# Altium footprint library myPcbLib.PcbLib: 987 footprints (part 43 of 62)
Each footprint in its own frame and in the unit in brackets; x right, y up, seen from the top. Pads: shape width x height; smd on the part's side, far side on the other; paste and mask are expansions set on the pad; w line width, h text height; cw(c..) or ccw(c..) is an arc to the next point about the centre after c.
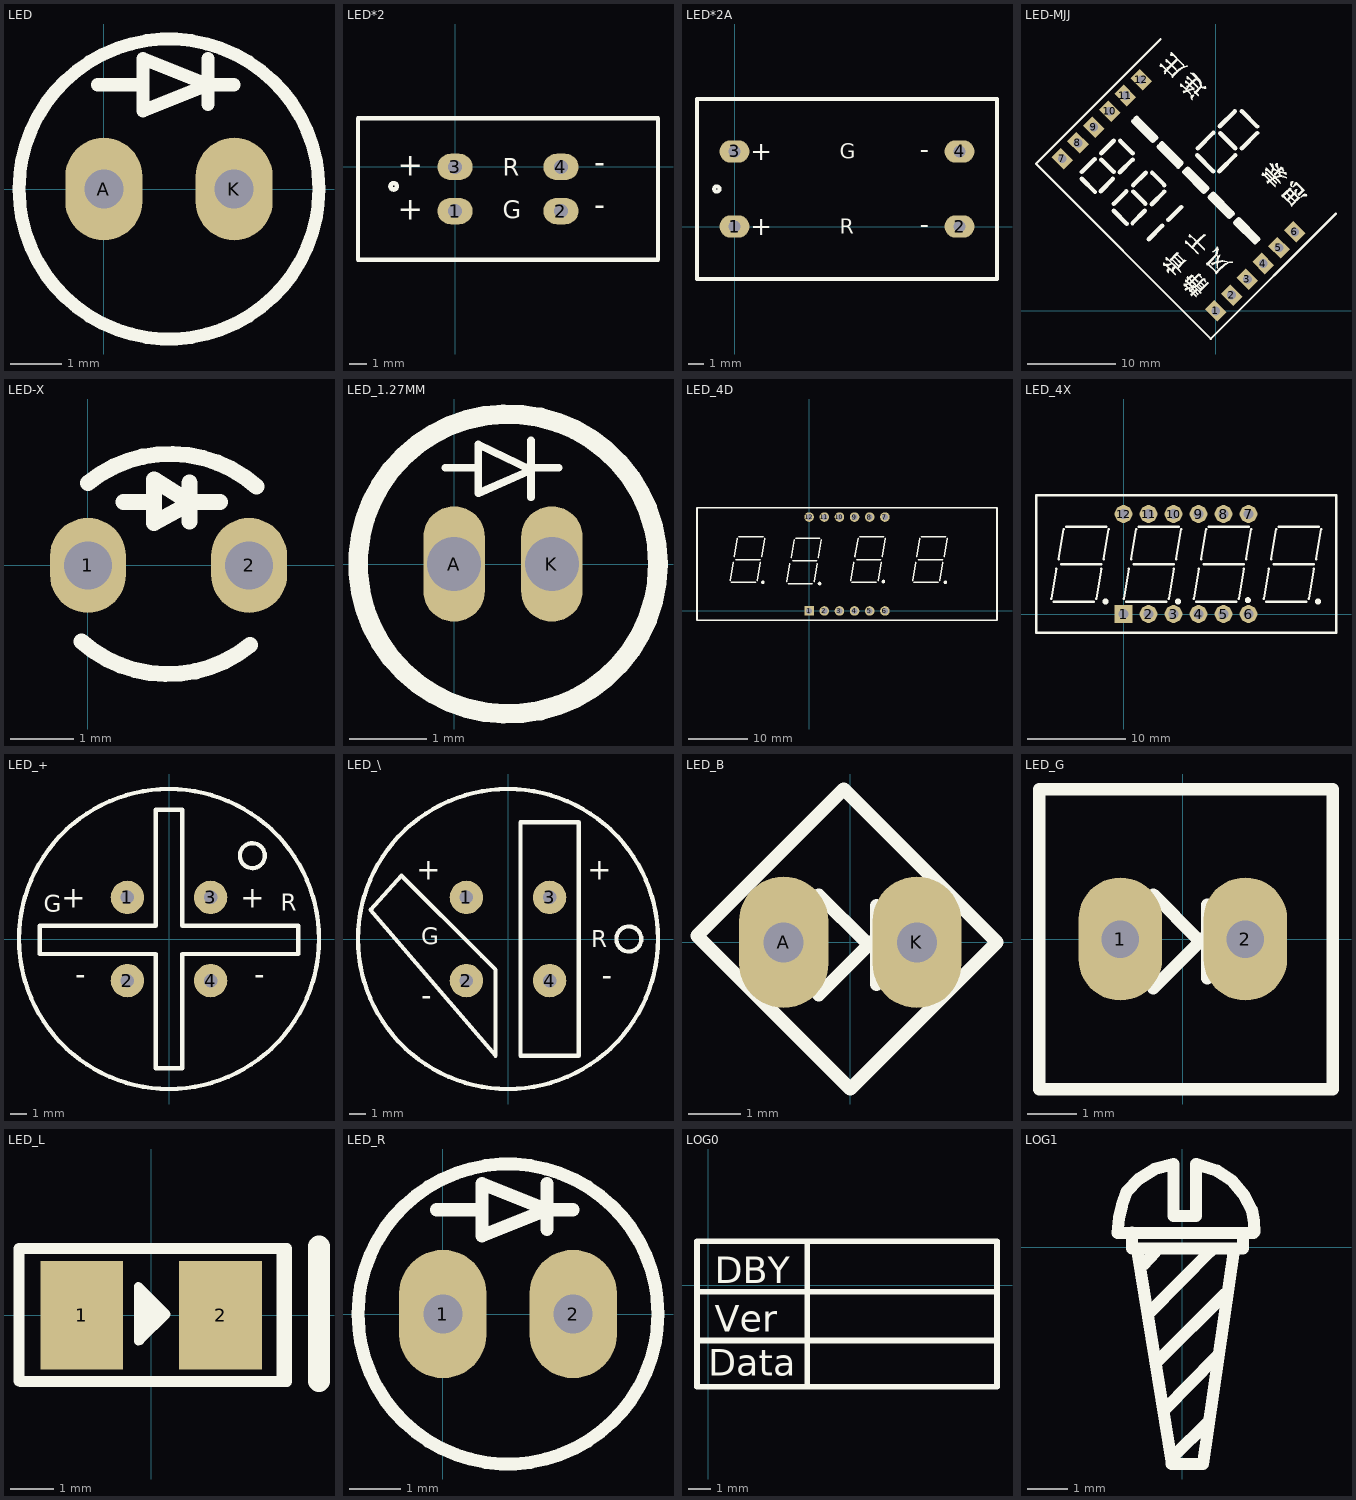
[diagram p42: the footprints below, top view; thin cyan lines are the x and y axes]

## LED [mm]
height 8
pads (2):
  oval 1.5x2 hole 0.762: A(0,0) K(2.54,0)
Top Overlay:
  circle w0.254: c1.27,0 r2.924
  lines w0.254: -0.127,2.032 0.762,2.032 ; 2.032,1.651 2.032,2.54 ; 2.54,2.032 2.032,2.032 ; 2.032,2.032 0.762,2.54 0.762,1.524 2.032,2.032

## LED*2 [mm]
pads (4):
  oval 2x1.5 hole 0.8: 1(0,-2.5) 2(6,-2.5) 3(0,0) 4(6,0)
Top Overlay:
  circle w0.254: c-3.48,-1.1 r0.18
  lines w0.254: -5.5,-5.25 11.5,-5.25 11.5,2.75 0,2.75 -5.5,2.75 -5.5,-5.25
  text "+" at -1.8,-1.9 h1.27
  text "-" at 8.5,-1.8 h1.27
  text "R" at 2.7,-0.5 h1
  text "G" at 2.7,-2.9 h1
  text "+" at -1.8,0.6 h1.27
  text "-" at 8.5,0.6 h1.27

## LED*2A [mm]
pads (4):
  oval 2x1.5 hole 0.8: 1(0,0) 2(15,0) 3(0,5) 4(15,5)
Top Overlay:
  circle w0.254: c-1.18,2.5 r0.18
  lines w0.254: -2.5,-3.5 17.5,-3.5 17.5,8.5 -2.5,8.5 -2.5,-3.5
  text "+" at 2.5,0.5 h1.27
  text "-" at 13,0.5 h1.27
  text "R" at 7,-0.5 h1
  text "G" at 7,4.5 h1
  text "+" at 2.5,5.5 h1.27
  text "-" at 13,5.5 h1.27

## LED-MJJ [mm]
pads (12):
  rect 1.5x2 hole 1 rot 45: 1(0,0) 2(1.796,1.796) 3(3.592,3.592) 4(5.388,5.388) 5(7.184,7.184) 6(8.98,8.98) 7(-17.452,17.293) 8(-15.656,19.089) 9(-13.86,20.885) 10(-12.064,22.681) 11(-10.268,24.477) 12(-8.472,26.273)
Top Overlay:
  drawing of 1385 lines, arcs and shapes, not listed

## LED-X [mm]
height 8
pads (2):
  oval 1.2x1.5 hole 0.762: 1(0,0) 2(2.54,0)
Top Overlay:
  lines w0.254: -0.1,-1.2 ccw(c1.259,0.337) 2.555,-1.253 ; 0,1.3 cw(c1.296,-0.291) 2.655,1.247 ; 0.559,1 1.016,1 ; 1.6,0.695 1.6,1.305 ; 1.6,1 1.041,1.356 1.041,0.67 1.651,1 ; 1.625,1 2.083,1

## LED_1.27MM [mm]
height 8
pads (2):
  oval 0.8x1.5 hole 0.7: A(0,0) K(1.27,0)
Top Overlay:
  circle w0.254: c0.7,0 r1.95
  lines w0.1: -0.118,1.25 0.314,1.25 ; 1,0.869 1,1.606 ; 1,1.25 1.356,1.25 ; 0.314,0.92 1,1.225 0.314,1.555 0.314,0.92

## LED_4D [mm]
pads (12):
  rect 1.6x1.6 hole 1: 1(0,0)
  round 1.6 hole 1: 2(2.54,0) 3(5.08,0) 4(7.62,0) 5(10.16,0) 6(12.7,0) 7(12.7,15.748) 8(10.16,15.748) 9(7.62,15.748) 10(5.08,15.748) 11(2.54,15.748) 12(0,15.748)
Top Overlay:
  circle w0.508: c-7.751,4.8 r0.051
  circle w0.508: c12.454,4.932 r0.051
  circle w0.508: c1.749,4.6 r0.051
  circle w0.508: c22.849,4.8 r0.051
  lines w0.254: -13.239,5.097 -12.731,8.145 ; -13.034,4.8 -8.97,4.8 ; -12.526,9.118 -12.018,12.166 ; -12.272,8.61 -8.208,8.61 ; -11.764,12.42 -7.7,12.42 ; -8.667,5.097 -8.159,8.145 ; -7.954,9.118 -7.446,12.166 ; -3.739,4.897 -3.231,7.945 ; -3.534,4.6 0.53,4.6 ; -3.026,8.918 -2.518,11.966 ; -2.772,8.41 1.292,8.41 ; -2.264,12.22 1.8,12.22 ; 0.833,4.897 1.341,7.945 ; 1.546,8.918 2.054,11.966 ; 6.978,5.1 7.486,8.148 ; 7.183,4.803 11.247,4.803 ; 7.691,9.121 8.199,12.169 ; 7.945,8.613 12.009,8.613 ; 8.453,12.423 12.517,12.423 ; 11.55,5.1 12.058,8.148 ; 12.263,9.121 12.771,12.169 ; 17.361,5.097 17.869,8.145 ; 17.566,4.8 21.63,4.8 ; 18.074,9.118 18.582,12.166 ; 18.328,8.61 22.392,8.61 ; 18.836,12.42 22.9,12.42 ; 21.933,5.097 22.441,8.145 ; 22.646,9.118 23.154,12.166 ; -18.796,-1.524 31.496,-1.524 31.496,17.272 -18.796,17.272 -18.796,-1.524

## LED_4X [mm]
pads (12):
  rect 1.8x1.8 hole 1: 1(0,0)
  round 1.8 hole 1: 2(2.54,0) 3(5.08,0) 4(7.62,0) 5(10.16,0) 6(12.7,0) 7(12.7,10.16) 8(10.16,10.16) 9(7.62,10.16) 10(5.08,10.16) 11(2.54,10.16) 12(0,10.16)
Top Overlay:
  circle w0.508: c19.761,1.27 r0.051
  circle w0.508: c5.537,1.27 r0.051
  circle w0.508: c12.637,1.399 r0.051
  circle w0.508: c-1.829,1.27 r0.051
  lines w0.254: -7.317,1.567 -6.809,4.615 ; -7.112,1.27 -3.048,1.27 ; -6.604,5.588 -6.096,8.636 ; -6.35,5.08 -2.286,5.08 ; -5.842,8.89 -1.778,8.89 ; -2.745,1.567 -2.237,4.615 ; -2.032,5.588 -1.524,8.636 ; 0.049,1.567 0.557,4.615 ; 0.254,1.27 4.318,1.27 ; 0.762,5.588 1.27,8.636 ; 1.016,5.08 5.08,5.08 ; 1.524,8.89 5.588,8.89 ; 4.621,1.567 5.129,4.615 ; 5.334,5.588 5.842,8.636 ; 7.161,1.567 7.669,4.615 ; 7.366,1.27 11.43,1.27 ; 7.874,5.588 8.382,8.636 ; 8.128,5.08 12.192,5.08 ; 8.636,8.89 12.7,8.89 ; 11.733,1.567 12.241,4.615 ; 12.446,5.588 12.954,8.636 ; 14.273,1.567 14.781,4.615 ; 14.478,1.27 18.542,1.27 ; 14.986,5.588 15.494,8.636 ; 15.24,5.08 19.304,5.08 ; 15.748,8.89 19.812,8.89 ; 18.845,1.567 19.353,4.615 ; 19.558,5.588 20.066,8.636 ; -8.89,-1.905 -8.89,12.065 21.59,12.065 21.59,-1.905 -8.89,-1.905

## LED_+ [mm]
pads (4):
  round 2 hole 0.8: 1(-2.5,2.5) 2(-2.5,-2.5) 3(2.5,2.5) 4(2.5,-2.5)
Top Overlay:
  circle w0.254: c5,5 r0.75
  circle w0.254: c0,0 r9
  lines w0.254: -7.75,-0.9 -0.8,-0.9 -0.8,-7.75 0.8,-7.75 0.8,-0.9 7.75,-0.9 7.75,0.8 0.8,0.8 0.8,7.75 -0.8,7.75 -0.8,0.8 -7.75,0.8 -7.75,-0.9
  text "-" at -5,-1.75 h1.27
  text "+" at -5,3 h1.27
  text "G" at -7.5,1.6 h1
  text "R" at 6.7,1.7 h1
  text "-" at 5.75,-1.75 h1.27
  text "+" at 5.75,3 h1.27

## LED_\ [mm]
pads (4):
  round 2 hole 0.8: 1(-2.5,2.5) 2(-2.5,-2.5) 3(2.5,2.5) 4(2.5,-2.5)
Top Overlay:
  circle w0.254: c7.25,0 r0.75
  circle w0.254: c0,0 r9
  lines w0.254: -8.25,1.75 -0.75,-7 -0.75,-1.841 -1.54,-1.051 -6.388,3.798 -8.25,1.75 ; 0.75,-7 0.75,7 4.25,7 4.25,-7 0.75,-7
  text "-" at -4.572,-3.023 h1.27
  text "+" at -4.039,4.674 h1.27
  text "G" at -5.207,-0.356 h1
  text "R" at 5,-0.5 h1
  text "-" at 6.248,-1.803 h1.27
  text "+" at 6.223,4.674 h1.27

## LED_B [mm]
height 8
pads (2):
  oval 1.7x2.5 hole 0.762: A(-1.27,0) K(1.27,0)
Top Overlay:
  lines w0.254: -1.6,0 -0.8,0 ; 0.4,0 -0.6,-1 -0.6,0.9 0.3,0 0.6,0 ; 0.5,-0.8 0.5,0 0.5,0.7 ; 0.7,0 1.5,0 ; -2.921,0.127 -0.127,2.921 2.794,0 0,-2.794 -2.921,0.127

## LED_G [mm]
height 8
pads (2):
  oval 1.7x2.5 hole 0.762: 1(-1.27,0) 2(1.27,0)
Top Overlay:
  lines w0.254: -1.6,0 -0.8,0 ; 0.4,0 -0.6,-1 -0.6,0.9 0.3,0 0.6,0 ; 0.5,-0.8 0.5,0 0.5,0.7 ; 0.7,0 1.5,0 ; -2.921,-3.048 -2.921,3.048 3.048,3.048 3.048,-3.048 -2.921,-3.048

## LED_L [mm]
pads (2):
  rect 1.9x2.5 smd: 1(-1.598,0) 2(1.598,0)
Top Overlay:
  lines w0.2: -0.296,-0.599 -0.296,0.671 0.349,0.025 -0.254,-0.578 ; -0.201,-0.282 0.148,0.068 ; -0.201,0.406 0.106,0.099 ; -0.138,-0.229 -0.138,0.364 ; 0,-0.059 0,0.163
  lines w0.25: -3.037,-1.509 -3.037,1.539 3.122,1.539 3.122,-1.52 -3.006,-1.52 ; 3.006,-1.414 3.006,1.454
  lines w0.5: 3.863,-1.509 3.863,1.581

## LED_R [mm]
height 8
pads (2):
  oval 1.7x2.5 hole 0.762: 1(0,0) 2(2.54,0)
Top Overlay:
  circle w0.254: c1.27,0 r2.924
  lines w0.254: -0.127,2.032 0.762,2.032 ; 2.032,1.651 2.032,2.54 ; 2.54,2.032 2.032,2.032 ; 2.032,2.032 0.762,1.524 0.762,2.54 2.032,2.032

## LOG0 [mm]
Top Overlay:
  lines w0.254: -0.5,-2.5 13.1,-2.5 ; -0.5,-0.3 13.1,-0.3 ; 4.5,-4.5 4.5,2 ; -0.5,-4.6 13.1,-4.6 13.1,2 -0.5,2 -0.5,-4.6
  text "Ver" at 0.3,-2.1 h1.2
  text "DBY" at 0.3,0.1 h1.2
  text "Data" at 0,-4.1 h1.2

## LOG1 [mm]
Top Overlay:
  lines w0.305: -1.251,0.366 -1.251,-0.036 1.522,-0.036 1.522,0.356 ; -1.113,-0.11 -0.256,-5.423 0.527,-5.423 1.3,-0.068 ; -0.976,-0.449 -0.669,-0.11 ; -0.817,-1.634 0.707,-0.099 ; -0.616,-2.851 1.088,-1.158 ; -0.425,-4.058 0.834,-2.766 ; -0.193,-5.211 0.633,-4.396 ; 1.786,0.356 -1.611,0.356 -1.579,0.726 -1.505,1.044 -1.378,1.403 -1.092,1.7 -0.69,1.954 -0.214,2.081 -0.214,0.779 0.347,0.779 0.347,2.081 0.876,1.911 1.257,1.657 1.564,1.276 1.744,0.927 1.797,0.641 1.808,0.387